# Altium footprint library USB Connectors.PcbLib: 40 footprints (part 2 of 3)
Each footprint in its own frame and in the unit in brackets; x right, y up, seen from the top. Pads: shape width x height; smd on the part's side, far side on the other; paste and mask are expansions set on the pad; w line width, h text height; cw(c..) or ccw(c..) is an arc to the next point about the centre after c.
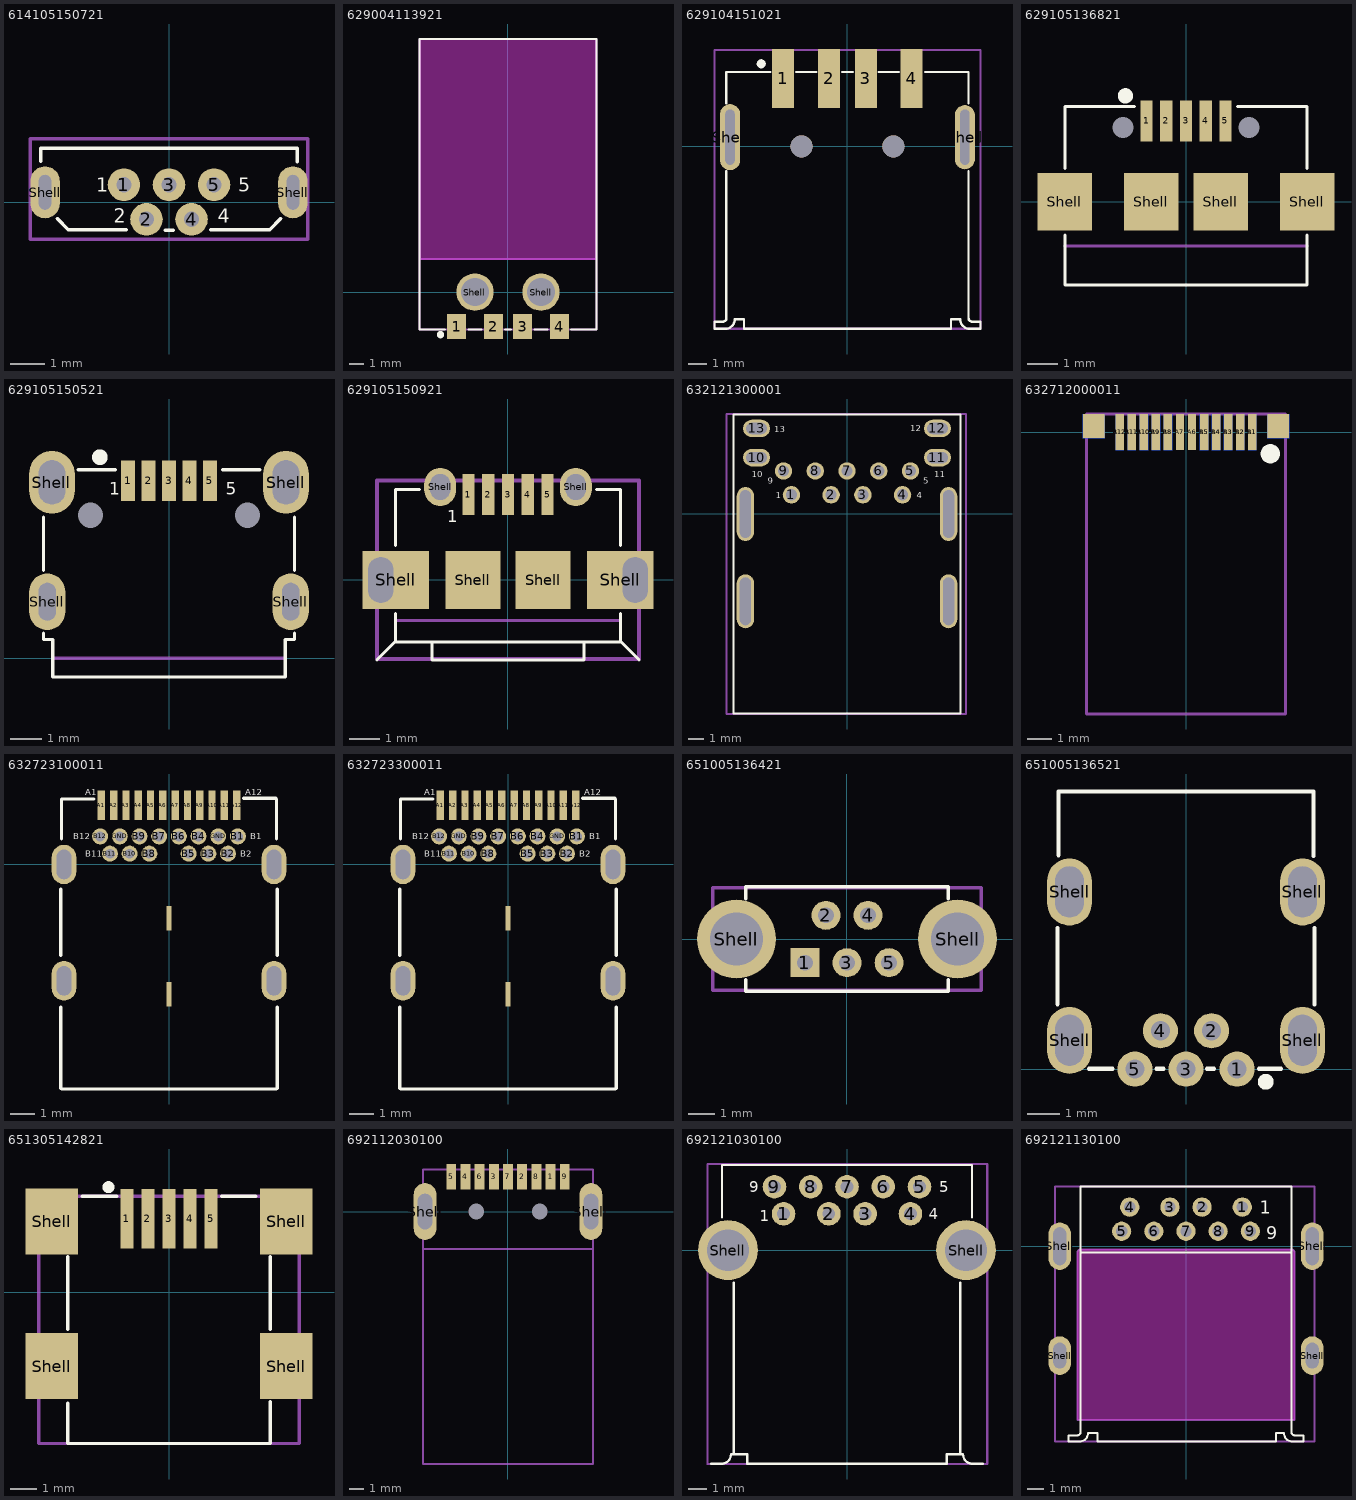
[diagram p1: the footprints below, top view; thin cyan lines are the x and y axes]

## 614105150721 [mm] "WR-COM_USB_Micro Type B_Vertical_THT Micro Type B Vertical THT"
height 5.61
pads (7):
  round 0.94 hole 0.44: 1(-1.3,0.5) 2(-0.65,-0.5) 3(0,0.5) 4(0.65,-0.5) 5(1.3,0.5)
  oval 0.85x1.5 hole 0.35 slot 1 at 90 deg: Shell(-3.575,0.28) Shell(3.575,0.28)
Top Overlay:
  lines w0.1: -3.7,1.17 -3.7,1.55 3.7,1.55 3.7,1.16 ; -3.225,-0.475 -2.9,-0.8 -1.23,-0.8 ; -0.11,-0.81 0.12,-0.81 ; 1.21,-0.8 2.9,-0.8 3.225,-0.475
  text "1" at -2.1,0.3 h0.4
  text "2" at -1.6,-0.6 h0.4
  text "4" at 1.4,-0.6 h0.4
  text "5" at 2,0.3 h0.4
Mechanical 13:
  lines w0.1: -4,-1.075 4,-1.075 4,1.825 -4,1.825 -4,-1.075
3D body: height 5.62, standoff -1.83, extent -3.995,-1.075 4.005,1.825

## 629004113921 [mm] "4 pins"
height 2.65
pads (6):
  rect 1.3x1.7 smd: 1(-3.5,-2.35) 2(-1,-2.35) 3(1,-2.35) 4(3.5,-2.35)
  round 2.55 hole 1.9: Shell(-2.25,0) Shell(2.25,0)
Top Overlay:
  circle w0.3: c-4.6,-2.9 r0.1
  lines w0.127: -2.7,-2.55 -1.8,-2.55 ; -0.2,-2.55 0.2,-2.55 ; 1.8,-2.55 2.7,-2.55 ; 4.3,-2.55 6.025,-2.55 6.025,17.25 -6.025,17.25 -6.025,-2.55 -4.3,-2.55 ; -4.3,-2.55 -4.3,-2.55
Keep-Out Layer:
  board cut-out: -6,17.25 6,17.25 6,2.25 -6,2.25
Mechanical 1:
  text "Milling Area" at -3.1,9.3 h1.52
Mechanical 1 keep-out:
  lines w0.127: -6,2.25 6,2.25 6,17.25 -6,17.25 -6,2.25
Mechanical 13:
  lines w0.127: -6.025,-2.55 6.025,-2.55 6.025,17.25 -6.025,17.25 -6.025,-2.55
3D body: height 1.86, standoff -2.64, extent -6.025,-2.55 6.025,17.25

## 629104151021 [mm] "WR-COM_USB_Type A_Horizontal_SMT Type A Horizontal SMT - with Pegs - T&R Packaging"
height 7
pads (8):
  rect 1.2x3.2 smd: 1(-3.5,3.7) 2(-1,3.7) 3(1,3.7) 4(3.5,3.7)
  oval 1.1x3.6 hole 0.5 slot 3 at 90 deg: Shell(-6.4,0.5)
  oval 1.1x3.5 hole 0.5 slot 3 at 90 deg: Shell(6.4,0.5)
  round 1.2 hole 1.2 unplated: ""(-2.5,0) ""(2.5,0)
Top Overlay:
  circle w0.254: c-4.7,4.5 r0.12
  lines w0.127: -6.6,-9.45 -6.6,-1.35 ; -6.601,-9.358 cw(c-6.798,-9.358) -6.798,-9.555 -7.25,-9.555 -7.25,-9.95 -6.667,-9.95 ccw(c-6.667,-9.423) -6.14,-9.423 -5.64,-9.423 -5.64,-9.95 5.64,-9.95 5.64,-9.423 6.14,-9.423 ccw(c6.667,-9.423) 6.667,-9.95 7.25,-9.95 7.25,-9.555 6.798,-9.555 cw(c6.798,-9.358) 6.601,-9.358 ; -6.601,2.351 -6.601,4.05 -4.2,4.05 ; -2.8,4.05 -1.7,4.05 ; -0.3,4.05 0.3,4.05 ; 1.7,4.05 2.8,4.05 ; 4.23,4.05 6.601,4.05 6.601,2.351 ; 6.6,-9.45 6.6,-1.35
Mechanical 13:
  lines w0.127: -7.25,-9.95 -7.25,5.25 7.25,5.25 7.25,-9.95 -7.25,-9.95
3D body: height 7.31, standoff -2.19, extent -7.25,-9.95 7.25,5.25

## 629105136821 [mm] "5 pins"
height 3
pads (11):
  rect 0.4x1.35 smd paste+0: 1(-1.3,2.675) 2(-0.65,2.675) 3(0,2.675) 4(0.65,2.675) 5(1.3,2.675)
  rect 1.8x1.9 smd: Shell(-4,0) Shell(-1.15,0) Shell(1.15,0) Shell(4,0)
  round 0.5 hole 0.7 unplated paste+0: ""(-2.075,2.45) ""(2.075,2.45)
Top Overlay:
  circle w0.3: c-2,3.5 r0.1
  lines w0.1: -4,-1.1 -4,-2.75 4,-2.75 4,-1.1 ; -4,1.1 -4,3.15 -1.7,3.15 ; 1.7,3.15 4,3.15 4,1.1
Mechanical 13:
  lines w0.1: -4,-1.45 4,-1.45
  text "PCB Edge" at -1.5,-2 h0.4
3D body: height 2.73, standoff -0.63, extent -4,-2.773 4,3.15

## 629105150521 [mm] "WR-COM_USB_Micro Type B_Horizontal_SMT Micro Type B Horizontal SMT - 3A current at Pin1 & Pin 5 - with Pegs and THT shielding Pins  - T&R Packaging"
height 2.6
pads (11):
  rect 0.45x1.3 smd: 1(-1.3,5.65) 2(-0.65,5.65) 3(0,5.65) 4(0.65,5.65) 5(1.3,5.65)
  oval 1.15x1.8 hole 0.55 slot 1.2 at 90 deg: Shell(-3.875,1.8) Shell(3.875,1.8)
  oval 1.45x2 hole 0.85 slot 1.4 at 90 deg: Shell(-3.725,5.6) Shell(3.725,5.6)
  round 0.5 hole 0.8 unplated paste+0: ""(-2.5,4.55) ""(2.5,4.55)
Top Overlay:
  circle w0.3: c-2.2,6.4 r0.1
  lines w0.1: -4,0.8 -4,0.6 -3.7,0.6 -3.7,-0.6 3.7,-0.6 3.7,0.6 4,0.6 4,0.8 ; -4,2.8 -4,4.5 ; -2.9,6 -1.7,6 ; 1.7,6 2.9,6 ; 4,2.8 4,4.5
  text "1" at -1.9,5.2 h0.4
  text "5" at 1.8,5.2 h0.4
Mechanical 13:
  lines w0.1: -3.7,0 3.7,0
  text "PCB Edge" at -1.3,0.2 h0.4
3D body: height 2.71, standoff -0.85, extent -4,-0.6 4,6.003

## 629105150921 [mm] "WR-COM_USB_Micro Type AB_Horizontal_SMT Micro Type AB Horizontal SMT - with Pegs - T&R Packaging"
height 5
pads (13):
  rect 0.4x1.35 smd: 1(-1.3,2.805) 2(-0.65,2.805) 3(0,2.805) 4(0.65,2.805) 5(1.3,2.805)
  round 0 hole 0.825 slot 1.5 at 90 deg: Shell(-4.175,0) Shell(4.175,0)
  rect 2.185x1.9 smd: Shell(-3.692,0) Shell(3.692,0)
  oval 1.05x1.25 hole 0.65 slot 0.85 at 90 deg: Shell(-2.225,3.055) Shell(2.225,3.055)
  rect 1.8x1.9 smd: Shell(-1.15,0) Shell(1.15,0)
Top Overlay:
  lines w0.1: -4.3,-2.623 -3.707,-2.03 -3.7,-2.03 ; -3.7,-1.1 -3.7,-2.03 ; -3.7,1.127 -3.7,2.97 -2.9,2.97 ; -3.67,-2.03 -2.5,-2.03 -2.5,-2.63 2.5,-2.63 2.5,-2.03 ; 2.9,2.97 3.7,2.97 3.7,1.127 ; 3.7,-1.1 3.7,-2.03 ; 4.3,-2.623 3.707,-2.03 3.7,-2.03 ; -3.7,-2.03 3.7,-2.03
  text "1" at -2,1.9 h0.4
Mechanical 13:
  lines w0.1: -3.7,-1.33 3.7,-1.33
  lines w0.127: -4.3,-2.599 4.3,-2.599 4.3,3.27 -4.3,3.27 -4.3,-2.599
  text "PCB Edge" at -1.6,-1.9 h0.4
3D body: height 2.73, standoff -0.55, extent -4.3,-2.599 4.3,3.27

## 632121300001 [mm] "USB 3.1_Type A_Horizontal_THT"
height 7.01
pads (17):
  round 1.1 hole 0.7: 1(-3.5,1.21) 2(-1,1.21) 3(1,1.21) 4(3.5,1.21) 5(4,2.71) 6(2,2.71) 7(0,2.71) 8(-2,2.71) 9(-4,2.71)
  oval 1.7x1.1 hole 0.7 slot 1.3 at 0 deg: 10(-5.7,3.55) 11(5.7,3.55) 12(5.7,5.39) 13(-5.7,5.39)
  oval 1.1x3.4 hole 0.7 slot 3 at 90 deg: ""(-6.4,-5.5) ""(-6.4,0) ""(6.4,-5.5) ""(6.4,0)
Top Overlay:
  lines w0.127: -7.15,-12.57 -7.15,6.26 7.15,6.26 7.15,-12.57 -7.15,-12.57
  text "12" at 4,5.2 h0.4
  text "11" at 5.5,2.3 h0.4
  text "10" at -6,2.3 h0.4
  text "9" at -5,1.9 h0.4
  text "5" at 4.8,1.9 h0.4
  text "4" at 4.4,1 h0.4
  text "1" at -4.5,1 h0.4
  text "13" at -4.57,5.15 h0.4
Mechanical 13:
  lines w0.127: -7.6,-12.6 7.5,-12.6 7.5,6.3 -7.6,6.3 -7.6,-12.6
3D body: height 8.06, standoff -1.76, extent -7.55,-12.59 7.55,6.24

## 632712000011 [mm] "Type C Plug Horizontal SMT"
height 4.2
pads (26):
  rect 0.35x1.5 smd: A1(2.75,0) A2(2.25,0) A3(1.75,0) A4(1.25,0) A5(0.75,0) A6(0.25,0) A7(-0.25,0) A8(-0.75,0) A9(-1.25,0) A10(-1.75,0) A11(-2.25,0) A12(-2.75,0)
  rect 0.35x1.5 smd far side: B1(2.75,0) B2(2.25,0) B3(1.75,0) B4(1.25,0) B5(0.75,0) B8(-0.75,0) B9(-1.25,0) B10(-1.75,0) B11(-2.25,0) B12(-2.75,0)
  rect 0.9x1 smd: ""(-3.825,0.25) ""(3.825,0.25)
  rect 0.9x1 smd far side: ""(-3.825,0.25) ""(3.825,0.25)
Top Overlay:
  circle w0.4: c3.5,-0.9 r0.2
Bottom Overlay:
  circle w0.4: c3.5,-0.9 r0.2
Mechanical 13:
  lines w0.127: -4.125,-11.7 4.125,-11.7 4.125,0.75 -4.125,0.75 -4.125,-11.7
3D body: height 1.9, standoff -2.3, extent -4.125,-11.7 4.125,0.75

## 632723100011 [mm] "USB 3.1_Type C_Horizontal_THT/SMT_1.0mm"
height 2.96
pads (32):
  rect 0.3x1.2 smd: A1(-2.75,2.4) A2(-2.25,2.4) A3(-1.75,2.4) A4(-1.25,2.4) A5(-0.75,2.4) A6(-0.25,2.4) A7(0.25,2.4) A8(0.75,2.4) A9(1.25,2.4) A10(1.75,2.4) A11(2.25,2.4) A12(2.75,2.4)
  round 0.65 hole 0.4: B1(2.8,1.14) B2(2.4,0.44) B3(1.6,0.44) B4(1.2,1.14) B5(0.8,0.44) B6(0.4,1.14) B7(-0.4,1.14) B8(-0.8,0.44) B9(-1.2,1.14) B10(-1.6,0.44) B11(-2.4,0.44) B12(-2.8,1.14) GND(-2,1.14) GND(2,1.14)
  oval 1x1.6 hole 0.6 slot 1.2 at 90 deg: ""(-4.27,-4.73) ""(-4.27,0) ""(4.27,-4.73) ""(4.27,0)
  rect 0.2x1 smd: ""(0,-5.28) ""(0,-2.18)
Top Overlay:
  lines w0.127: -4.4,-9.1 -4.4,-5.8 ; -4.4,-3.7 -4.4,-1 ; -4.37,-9.13 4.37,-9.13 ; -4.37,1.03 -4.37,2.67 -3.06,2.67 ; 3.03,2.694 4.34,2.694 ; 4.37,1.03 4.37,2.67 ; 4.4,-9.1 4.4,-5.8 ; 4.4,-3.7 4.4,-1
  text "B11" at -3.4,0.32 h0.25
  text "B2" at 2.9,0.32 h0.25
  text "B1" at 3.3,1.02 h0.25
  text "B12" at -3.9,1.02 h0.25
  text "A12" at 3.1,2.82 h0.25
  text "A1" at -3.4,2.82 h0.25
3D body: height 3.08, standoff -1.38, extent -4.4,-9.1 4.34,2.694

## 632723300011 [mm] "USB 3.1_Type C_Horizontal_THT/SMT"
height 2.96
pads (32):
  rect 0.3x1.2 smd: A1(-2.75,2.4) A2(-2.25,2.4) A3(-1.75,2.4) A4(-1.25,2.4) A5(-0.75,2.4) A6(-0.25,2.4) A7(0.25,2.4) A8(0.75,2.4) A9(1.25,2.4) A10(1.75,2.4) A11(2.25,2.4) A12(2.75,2.4)
  round 0.65 hole 0.4: B1(2.8,1.14) B2(2.4,0.44) B3(1.6,0.44) B4(1.2,1.14) B5(0.8,0.44) B6(0.4,1.14) B7(-0.4,1.14) B8(-0.8,0.44) B9(-1.2,1.14) B10(-1.6,0.44) B11(-2.4,0.44) B12(-2.8,1.14) GND(-2,1.14) GND(2,1.14)
  oval 1x1.6 hole 0.6 slot 1.2 at 90 deg: ""(-4.27,-4.73) ""(-4.27,0) ""(4.27,-4.73) ""(4.27,0)
  rect 0.2x1 smd: ""(0,-5.28) ""(0,-2.18)
Top Overlay:
  lines w0.127: -4.4,-9.1 -4.4,-5.8 ; -4.4,-3.7 -4.4,-1 ; -4.37,-9.13 4.37,-9.13 ; -4.37,1.03 -4.37,2.67 -3.06,2.67 ; 3.03,2.694 4.34,2.694 ; 4.37,1.03 4.37,2.67 ; 4.4,-9.1 4.4,-5.8 ; 4.4,-3.7 4.4,-1
  text "A1" at -3.4,2.82 h0.25
  text "A12" at 3.1,2.82 h0.25
  text "B12" at -3.9,1.02 h0.25
  text "B1" at 3.3,1.02 h0.25
  text "B2" at 2.9,0.32 h0.25
  text "B11" at -3.4,0.32 h0.25
3D body: height 3.08, standoff -1.78, extent -4.4,-9.1 4.34,2.694

## 651005136421 [mm] "5 pins"
height 3.9
pads (7):
  rect 1.1x1.1 hole 0.6: 1(-1.6,-0.9)
  round 1.1 hole 0.6: 2(-0.8,0.9) 3(0,-0.9) 4(0.8,0.9) 5(1.6,-0.9)
  round 3 hole 2: Shell(-4.2,0) Shell(4.2,0)
Top Overlay:
  lines w0.127: -3.85,-1.55 -3.85,-1.98 3.85,-1.98 3.85,-1.55 ; -3.85,1.53 -3.85,1.98 3.85,1.98 3.85,1.53
Mechanical 13:
  lines w0.127: -5.098,-1.95 -5.098,1.95 5.098,1.95 5.098,-1.95 -5.098,-1.95
3D body: height 9.21, standoff -2.79, extent -5.098,-1.95 5.098,1.95

## 651005136521 [mm] "5 pins"
height 3.9
pads (9):
  round 1.1 hole 0.6: 1(1.6,0) 2(0.8,1.2) 3(0,0) 4(-0.8,1.2) 5(-1.6,0)
  oval 1.4x2.1 hole 0.9 slot 1.6 at 90 deg: Shell(-3.65,0.9) Shell(-3.65,5.55) Shell(3.65,0.9) Shell(3.65,5.55)
Top Overlay:
  circle w0.254: c2.5,-0.4 r0.12
  lines w0.127: -4.02,2.03 -4.02,4.42 ; -4,6.7 -4,8.7 4,8.7 4,6.67 ; -3.04,0.01 -2.3,0.01 ; -0.92,0.01 -0.71,0.01 ; 0.66,0.01 0.88,0.01 ; 2.29,0.01 2.98,0.01 ; 4.02,2.02 4.02,4.42
3D body: height 3.91, standoff -2.59, extent -4.075,-0.125 4.075,8.7

## 651305142821 [mm] "5 pins"
height 4
pads (9):
  rect 0.5x2.25 smd: 1(-1.6,2.8) 2(-0.8,2.8) 3(0,2.8) 4(0.8,2.8) 5(1.6,2.8)
  rect 2x2.5 smd: Shell(-4.45,-2.8) Shell(-4.45,2.7) Shell(4.45,-2.8) Shell(4.45,2.7)
Top Overlay:
  circle w0.254: c-2.3,4 r0.1
  lines w0.127: -3.85,-4.2 -3.85,-5.74 3.85,-5.74 ; -3.85,-1.4 -3.85,1.35 ; -3.3,3.66 -1.99,3.66 ; 2,3.66 3.3,3.66 ; 3.85,-5.74 3.85,-4.15 ; 3.85,-1.4 3.85,1.35
Mechanical 13:
  lines w0.127: -4.95,-5.74 4.95,-5.74 4.95,3.66 -4.95,3.66 -4.95,-5.74
3D body: height -0.4, standoff -4.5, extent -4.95,-5.74 4.95,3.66

## 692112030100 [mm] "Plug SMT"
height 0.85
pads (13):
  rect 0.7x1.8 smd: 1(3,2.45) 2(1,2.45) 3(-1,2.45) 4(-3,2.45) 5(-4,2.45) 6(-2,2.45) 7(0,2.45) 8(2,2.45) 9(4,2.45)
  oval 1.6x4 hole 1 slot 2.5 at 90 deg: Shell(-5.85,0) Shell(5.85,0)
  round 1 hole 1.1 unplated: ""(-2.25,0) ""(2.25,0)
Mechanical 13:
  lines w0.127: -6,-2.65 6,-2.65 ; -6,2.954 -6,-17.8 6,-17.8 6,2.954 ; -5.998,2.954 6.002,2.954
  text "1" at 2.9,0.6 h0.6
  text "2" at 0.8,0.6 h0.6
  text "3" at -1.2,0.6 h0.6
  text "4" at -3.3,0.6 h0.6
  text "5" at -4.2,0.6 h0.6
  text "6" at -2.2,0.6 h0.6
  text "7" at -0.2,0.6 h0.6
  text "8" at 1.8,0.6 h0.6
  text "9" at 3.8,0.6 h0.6
  text "PCB Edge" at -2.1,-3.8 h0.6
3D body: height 1.89, standoff -2.61, extent -5.998,-17.8 6.002,2.954

## 692121030100 [mm] "Receptacle Through hole"
height 6.99
pads (11):
  round 1.3 hole 0.7: 1(-3.5,2) 2(-1,2) 3(1,2) 4(3.5,2) 5(4,3.5) 6(2,3.5) 7(0,3.5) 8(-2,3.5) 9(-4,3.5)
  round 3.3 hole 2.3: Shell(-6.57,0) Shell(6.57,0)
Top Overlay:
  lines w0.127: -7.5,-11.792 -6.927,-11.792 ccw(c-6.926,-11.266) -6.4,-11.266 -5.5,-11.266 -5.5,-11.792 5.5,-11.792 5.5,-11.266 6.4,-11.266 ccw(c6.927,-11.266) 6.927,-11.792 7.5,-11.792 ; -6.9,1.8 -6.9,4.7 6.9,4.7 6.9,1.8 ; -6.25,-11.2 -6.25,-1.8 ; 6.25,-11.2 6.25,-1.8
  text "9" at -5.4,3.2 h0.6
  text "5" at 5.1,3.2 h0.6
  text "4" at 4.5,1.7 h0.6
  text "1" at -4.8,1.6 h0.6
Mechanical 13:
  lines w0.127: -7.7,-11.792 -7.7,4.75 7.74,4.75 7.74,-11.8 -7.692,-11.8 -7.7,-11.792
3D body: height 8.07, standoff -3.16, extent -7.74,-11.8 7.74,4.75

## 692121130100 [mm] "Receptacle TH Reverse Offset 0.14mm"
height 1.84
pads (13):
  round 1.2 hole 0.7: 1(3.5,2.43) 2(1,2.43) 3(-1,2.43) 4(-3.5,2.43) 5(-4,0.93) 6(-2,0.93) 7(0,0.93) 8(2,0.93) 9(4,0.93)
  oval 1.4x2.4 hole 0.8 slot 1.6 at 90 deg: Shell(-7.85,-6.8) Shell(7.85,-6.8)
  oval 1.4x2.95 hole 0.8 slot 2.35 at 90 deg: Shell(-7.85,0) Shell(7.85,0)
Top Overlay:
  lines w0.127: -6.552,-11.558 cw(c-6.75,-11.558) -6.75,-11.755 -7.315,-11.755 -7.315,-12.15 -6.618,-12.15 ccw(c-6.618,-11.624) -6.092,-11.624 -5.51,-11.624 -5.51,-12.15 5.592,-12.15 5.592,-11.624 6.092,-11.624 ccw(c6.618,-11.624) 6.618,-12.15 7.315,-12.15 7.315,-11.755 6.75,-11.755 cw(c6.75,-11.558) 6.553,-11.558 ; -6.55,-11.59 -6.55,3.72 6.55,3.72 6.55,-11.55 ; -6.55,-0.4 6.55,-0.4
  text "9" at 5,0.43 h0.8
  text "1" at 4.6,2.03 h0.8
Keep-Out Layer:
  board cut-out: -6.75,-10.8 6.75,-10.8 6.75,-0.4 6.754,-0.4 6.738,-0.322 6.694,-0.256 6.628,-0.211 6.55,-0.196 6.55,-0.2 -6.55,-0.196 -6.628,-0.212 -6.694,-0.256 -6.739,-0.322 -6.754,-0.4 -6.75,-0.4
Mechanical 1:
  text "Milling Area" at -3.6,-6.77 h1.52
Mechanical 13:
  lines w0.127: 6.55,-0.2 6.55,-0.2 -6.55,-0.2 ccw(c-6.55,-0.4) -6.75,-0.4 -6.75,-10.8 ; 6.55,-0.2 cw(c6.55,-0.4) 6.75,-0.4 ; -6.75,-10.8 -6.75,-10.8 ; -6.75,-10.8 6.75,-10.8 6.75,-0.4 ; 6.75,-0.4 6.75,-0.4 ; -8.156,-12.15 -8.156,3.72 8,3.72 8,-12.15 -8.156,-12.15
3D body: height 3.95, standoff -3.77, extent -8.156,-12.15 8,3.72